# Altium footprint library lib_datalogger.PcbLib: 866 footprints (part 38 of 55)
Each footprint in its own frame and in the unit in brackets; x right, y up, seen from the top. Pads: shape width x height; smd on the part's side, far side on the other; paste and mask are expansions set on the pad; w line width, h text height; cw(c..) or ccw(c..) is an arc to the next point about the centre after c.
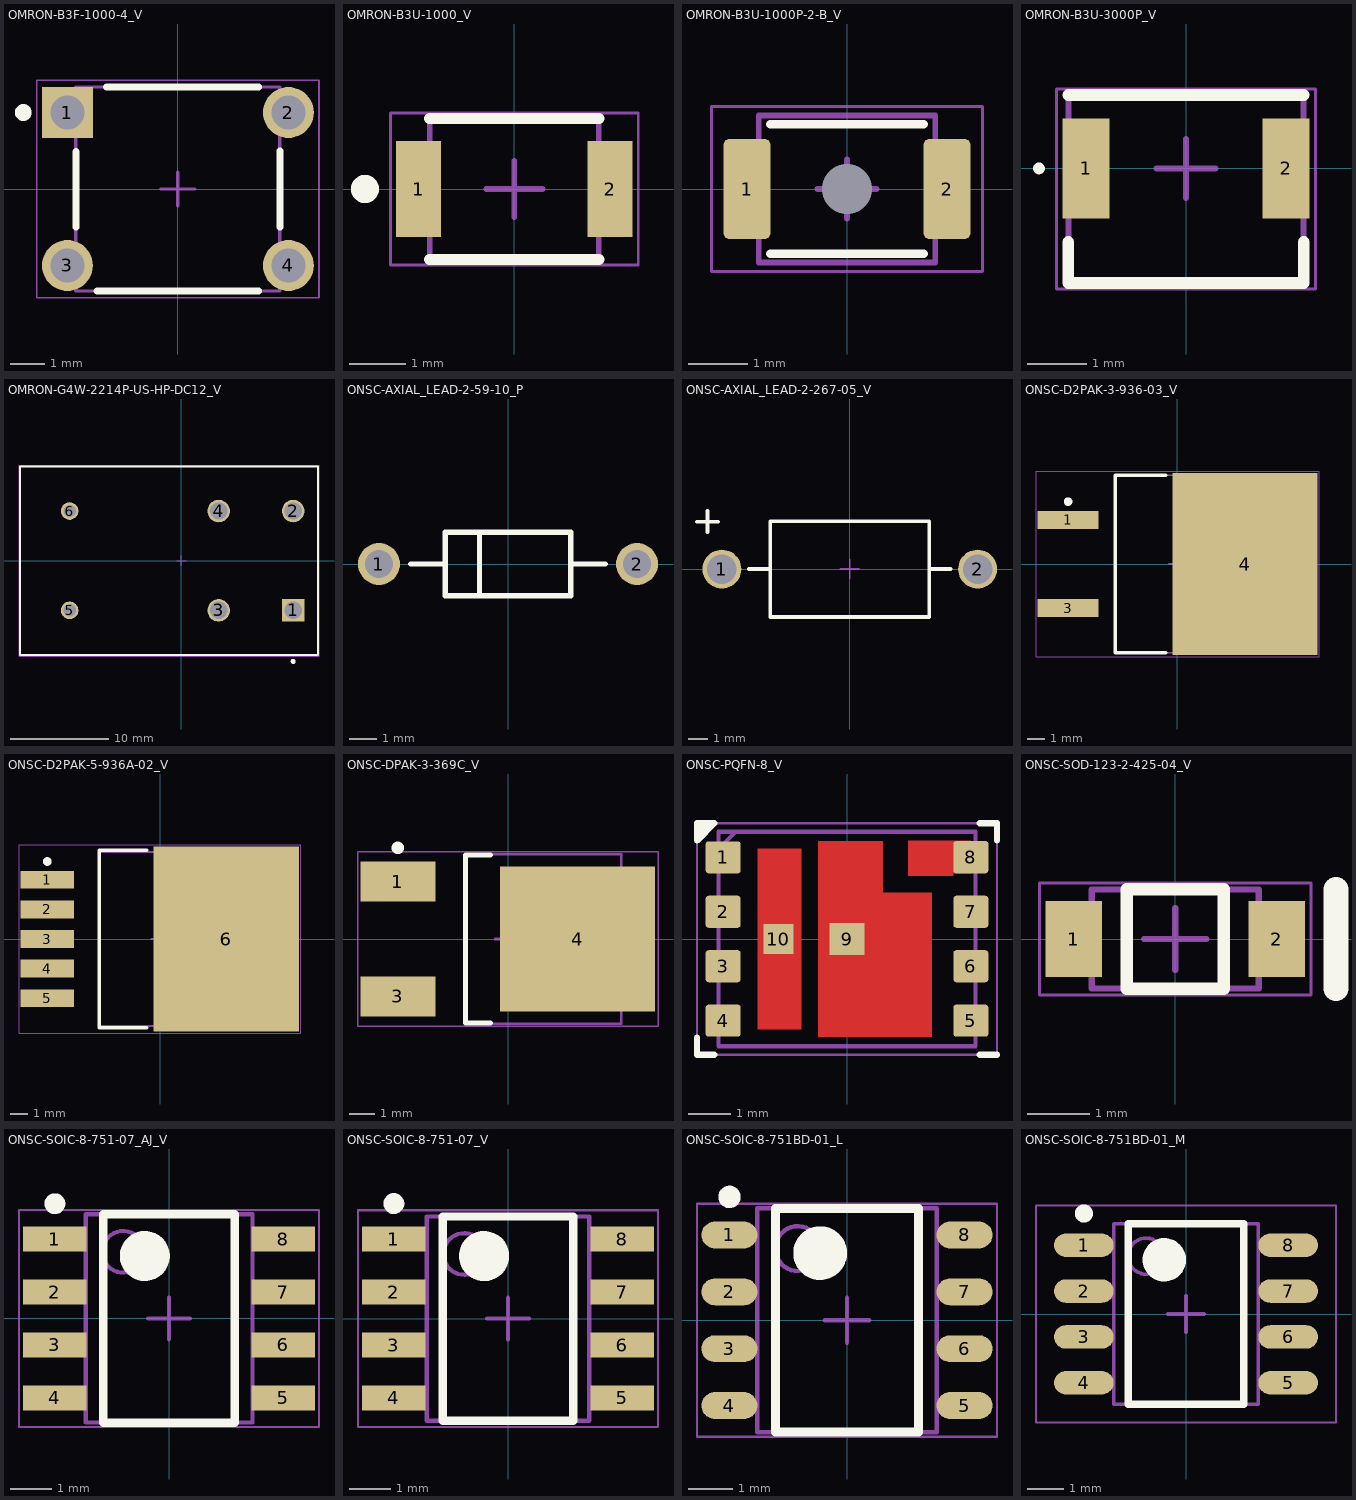
[diagram p37: the footprints below, top view; thin cyan lines are the x and y axes]

## OMRON-B3F-1000-4_V [mm] "TH, 4-Leads, Body 6x6mm"
height 4.5
pads (4):
  rect 1.5x1.5 hole 1 paste+0: 1(-3.25,2.25)
  round 1.5 hole 1 paste+0: 2(3.25,2.25) 4(3.25,-2.25)
  round 1.5 hole 1 paste+0 mask+0.102: 3(-3.25,-2.25)
Top Overlay:
  circle w0.25: c-4.55,2.25 r0.125
  lines w0.2: -3,-1.127 -3,1.1 ; -2.378,-3 2.378,-3 ; -2.1,3 2.378,3 ; 3,-1.127 3,1.127
Mechanical 13:
  lines w0.1: -3,-3 -3,3 3,3 3,-3 -3,-3
Mechanical 15:
  lines w0.05: -4.15,-3.2 -4.15,3.2 4.15,3.2 4.15,-3.2 -4.15,-3.2
  lines w0.1: -0.5,0 0.5,0 ; 0,-0.5 0,0.5
3D body: height 3.7, standoff 0.1, extent -2.499,1.501 -1.501,2.499
3D body: height 3.7, standoff 0.1, extent 1.501,-2.499 2.499,-1.501
3D body: height 3.7, standoff 0.1, extent -2.499,-2.499 -1.501,-1.501
3D body: height 3.7, standoff 0.1, extent 1.501,1.501 2.499,2.499
3D body: height 0.5, standoff -3.5, extent 3.101,1.901 3.4,2.599
3D body: height 0.8, standoff 0.5, extent 2.801,1.901 3.4,2.599
3D body: height 0.5, standoff -3.5, extent -3.4,-2.599 -3.101,-1.901
3D body: height 0.8, standoff 0.5, extent -3.4,-2.599 -2.801,-1.901
3D body: height 0.5, standoff -3.5, extent 3.101,-2.599 3.4,-1.901
3D body: height 0.8, standoff 0.5, extent 2.801,-2.599 3.4,-1.901
3D body: height 0.8, standoff 0.5, extent -3.4,1.901 -2.801,2.599
3D body: height 0.5, standoff -3.5, extent -3.4,1.901 -3.101,2.599
3D body: height 4.5, standoff 0.1, extent -1.75,-1.75 1.749,1.749
3D body: height 3.4, standoff 0, extent -3,-3 3,3

## OMRON-B3U-1000_V [mm] "SMD, 2-Leads, Body 3x2.5mm"
height 1.75
pads (2):
  rect 0.8x1.7 smd: 1(-1.7,0) 2(1.7,0)
Top Overlay:
  circle w0.25: c-2.65,0 r0.125
  lines w0.2: -1.5,-1.25 1.5,-1.25 ; -1.5,1.25 1.5,1.25
Mechanical 13:
  lines w0.1: -1.5,-1.25 1.5,-1.25 1.5,1.25 -1.5,1.25 -1.5,-1.25
Mechanical 15:
  lines w0.05: -2.2,-1.35 2.2,-1.35 2.2,1.35 -2.2,1.35 -2.2,-1.35
  lines w0.1: -0.5,0 0.5,0 ; 0,-0.5 0,0.5
3D body: height 1.75, standoff 1.35, extent -0.75,-0.75 0.75,0.75
3D body: height 1.35, standoff 0, extent -1.5,-1.25 1.5,1.25

## OMRON-B3U-1000P-2-B_V [mm] "SMT, 2-Leads, Body 3x2.5mm"
height 1.75
pads (3):
  rrect25% 0.8x1.7 smd: 1(-1.7,0) 2(1.7,0)
  round 0 hole 0.85 unplated: H1(0,0)
Top Overlay:
  lines w0.15: -1.3,-1.1 1.3,-1.1 ; -1.3,1.1 1.3,1.1
Mechanical 13:
  lines w0.1: -1.5,-1.25 1.5,-1.25 1.5,1.25 -1.5,1.25 -1.5,-1.25
Mechanical 15:
  lines w0.05: -2.3,-1.4 2.3,-1.4 2.3,1.4 -2.3,1.4 -2.3,-1.4
  lines w0.1: -0.5,0 0.5,0 ; 0,-0.5 0,0.5
Top Designator:
  text ".Designator" at -1.27,-0.127 h0.6
3D body "OMRON_B3U1000P.step": height 1.6, standoff 0, extent -2,-1.25 2,1.25

## OMRON-B3U-3000P_V [mm] "SMD, 2-Leads, Body 4x3.2mm"
height 1.35
pads (2):
  rect 0.8x1.7 smd: 1(-1.7,0) 2(1.7,0)
Top Overlay:
  circle w0.1: c-2.5,0 r0.05
  lines w0.2: -2,-1.25 -2,-1.95 2,-1.95 2,-1.25 ; -2,1.25 2,1.25
Mechanical 13:
  lines w0.1: -2,-1.95 -2,1.25 2,1.25 2,-1.95 -2,-1.95
Mechanical 15:
  lines w0.05: -2.2,-2.05 2.2,-2.05 2.2,1.35 -2.2,1.35 -2.2,-2.05
  lines w0.1: -0.5,0 0.5,0 ; 0,-0.5 0,0.5
3D body "B3U_3000P[].step": height 1.2, standoff 0, extent -2,-1.95 2,1.25

## OMRON-G4W-2214P-US-HP-DC12_V [mm] "Relay, 6-Leads, Body 30.48x19.3mm"
height 30.48
pads (6):
  rect 2.3x2.3 hole 1.778: 1(11.43,-5.08)
  round 2.3 hole 1.778: 2(11.43,5.08) 3(3.81,-5.08) 4(3.81,5.08)
  round 1.8 hole 1.27: 5(-11.43,-5.08) 6(-11.43,5.08)
Top Overlay:
  circle w0.25: c11.43,-10.3 r0.125
  lines w0.2: -16.51,-9.65 13.97,-9.65 13.97,9.65 -16.51,9.65 -16.51,-9.65
Mechanical 13:
  lines w0.1: -16.51,-9.65 13.97,-9.65 13.97,9.65 -16.51,9.65 -16.51,-9.65
Mechanical 15:
  lines w0.05: -16.61,-9.75 14.07,-9.75 14.07,9.75 -16.61,9.75 -16.61,-9.75
  lines w0.1: -0.5,0 0.5,0 ; 0,-0.5 0,0.5
3D body: height 30.48, standoff 0, extent -16.509,-9.649 13.969,9.649

## ONSC-AXIAL_LEAD-2-59-10_P [mm] "AXIAL, 2-Leads, Diameter 2.35mm"
height 2.35
pads (2):
  round 1.55 hole 1.05: 1(-4.77,0) 2(4.77,0)
Top Overlay:
  lines w0.2: -3.595,0 -2.325,0 ; -1.055,-1.175 -1.055,1.175 ; 2.325,0 3.595,0 ; -2.325,-1.175 2.325,-1.175 2.325,1.175 -2.325,1.175 -2.325,-1.175
Mechanical 13:
  lines w0.1: -1.055,-1.175 -1.055,1.175 ; -2.325,-1.175 -2.325,1.175 2.325,1.175 2.325,-1.175 -2.325,-1.175
3D body: height 2.34, standoff 0, extent -1.155,-1.174 -0.955,1.174
3D body: height 1.17, standoff -6, extent 4.381,-0.392 5.163,0.392
3D body: height 1.17, standoff -6, extent -5.159,-0.392 -4.377,0.392
3D body: height 1.57, standoff 0.78, extent 4.378,-0.39 5.163,0.39
3D body: height 1.57, standoff 0.78, extent -5.162,-0.39 -4.377,0.39
3D body: height 1.56, standoff 0.78, extent -4.77,-0.392 4.77,0.392
3D body: height 2.34, standoff 0, extent -2.325,-1.173 2.325,1.173

## ONSC-AXIAL_LEAD-2-267-05_V [mm] "AXIAL, 2-Leads, Diameter 5.05mm"
height 5.3
pads (2):
  round 2.05 hole 1.55: 1(-6.745,0) 2(6.745,0)
Top Overlay:
  lines w0.2: -8.06,2.5 -6.94,2.5 ; -7.5,1.94 -7.5,3.06 ; -5.32,0 -4.2,0 ; 4.2,0 5.32,0 ; -4.2,-2.525 -4.2,2.525 4.2,2.525 4.2,-2.525 -4.2,-2.525
Mechanical 13:
  lines w0.1: -4.2,-2.525 4.2,-2.525 4.2,2.525 -4.2,2.525 -4.2,-2.525
Mechanical 15:
  lines w0.1: -0.5,0 0.5,0 ; 0,-0.5 0,0.5
3D body: height 2.53, standoff -4.47, extent 6.125,-0.624 7.37,0.624
3D body: height 2.53, standoff -4.47, extent -7.365,-0.624 -6.12,0.624
3D body: height 3.15, standoff 1.9, extent 6.126,-0.622 7.37,0.623
3D body: height 3.15, standoff 1.9, extent -7.364,-0.622 -6.12,0.623
3D body: height 3.15, standoff 1.9, extent -6.745,-0.624 6.745,0.624
3D body: height 5.07, standoff 0.03, extent -4.2,-2.497 4.2,2.547

## ONSC-D2PAK-3-936-03_V [mm] "DPAK, 3-Leads, Body 10.24x9.35mm, Pitch 2.54mm"
height 4.572
pads (3):
  rect 3.504x1.016 smd: 1(-6.313,2.54) 3(-6.313,-2.54)
  rect 8.38x10.49 smd: 4(3.9,0)
Top Overlay:
  circle w0.25: c-6.313,3.598 r0.125
  lines w0.2: -0.69,-5.12 -3.6,-5.12 -3.6,5.12 -0.69,5.12
Mechanical 13:
  lines w0.1: -3.6,-5.12 -3.6,5.12 5.75,5.12 5.75,-5.12 -3.6,-5.12
Mechanical 15:
  lines w0.05: -8.164,-5.345 -8.164,5.345 8.189,5.345 8.189,-5.345 -8.164,-5.345
  lines w0.1: -0.5,0 0.5,0 ; 0,-0.5 0,0.5
3D body "DPAK254P1420X475-3L.step": height 4.75, standoff 0, extent -6.113,-5.125 8.086,5.125

## ONSC-D2PAK-5-936A-02_V [mm] "DPAK, 5-Leads, Body 10.02x9.194mm, Pitch 1.702mm"
height 4.58
pads (6):
  rect 3.05x1.016 smd: 1(-6.505,3.4) 2(-6.505,1.7) 3(-6.505,0) 4(-6.505,-1.7) 5(-6.505,-3.4)
  rect 8.38x10.66 smd: 6(3.8,0)
Top Overlay:
  circle w0.25: c-6.505,4.458 r0.125
  lines w0.2: -0.79,-5.118 -3.5,-5.118 -3.5,5.118 -0.79,5.118
Mechanical 13:
  lines w0.1: -3.5,-5.01 -3.5,5.01 5.694,5.01 5.694,-5.01 -3.5,-5.01
Mechanical 15:
  lines w0.05: -8.13,-5.43 -8.13,5.43 8.09,5.43 8.09,-5.43 -8.13,-5.43
  lines w0.1: -0.5,0 0.5,0 ; 0,-0.5 0,0.5
3D body "DPAK170P1420X457-6L.step": height 4.57, standoff 0, extent -6.219,-5.01 7.98,5.01

## ONSC-DPAK-3-369C_V [mm] "DPAK, 3-Leads, Body 6.22x6.75mm, Pitch 2.29mm"
height 2.47
pads (3):
  rect 3x1.6 smd: 1(-4.4,2.29) 3(-4.4,-2.29)
  rect 6.2x5.8 smd: 4(2.78,0)
Top Overlay:
  circle w0.25: c-4.4,3.64 r0.125
  lines w0.2: -0.7,-3.35 -1.7,-3.35 -1.7,3.35 -0.7,3.35
Mechanical 13:
  lines w0.1: -1.7,-3.375 4.52,-3.375 4.52,3.375 -1.7,3.375 -1.7,-3.375
Mechanical 15:
  lines w0.05: -5.99,-3.475 5.99,-3.475 5.99,3.475 -5.99,3.475 -5.99,-3.475
  lines w0.1: -0.5,0 0.5,0 ; 0,-0.5 0,0.5
3D body "DPAK229P991X246-3L.step": height 2.46, standoff 0, extent -5.385,-3.375 4.52,3.375

## ONSC-PQFN-8_V [mm] "QFN, 8-Leads, Body 5x6mm, Pitch 1.27mm"
height 0.8
pads (10):
  rrect20% 0.82x0.75 smd: 1(-2.89,1.905) 2(-2.89,0.635) 3(-2.89,-0.635) 4(-2.89,-1.905) 5(2.89,-1.905) 6(2.89,-0.635) 7(2.89,0.635)
  rrect20% 0.82x0.76 smd: 8(2.89,1.91)
  rect 0.82x0.75 smd: 9(0,0)
  rect 0.7x0.7 smd: 10(-1.6,0)
Top Layer:
  region: -1.07,-2.1 -1.07,2.1 -2.08,2.1 -2.08,-2.1
  region: 1.98,-2.28 -0.67,-2.28 -0.67,2.28 0.83,2.28 0.83,1.08 1.98,1.08
  region: 2.48,1.48 2.48,1.53 2.89,1.53 2.89,2.29 1.43,2.29 1.43,1.48
Top Overlay:
  region: -3.5,2.7 -3.5,2.3 -3.1,2.7
  lines w0.15: -3.5,-2.3 -3.5,-2.7 -3.1,-2.7 ; 3.1,-2.7 3.5,-2.7 ; 3.1,2.7 3.5,2.7 3.5,2.3 ; -3.5,2.3 -3.5,2.7 -3.1,2.7 -3.5,2.3
Mechanical 13:
  lines w0.1: -3,2.1 -2.6,2.5 ; -3,-2.5 -3,2.5 3,2.5 3,-2.5 -3,-2.5
Mechanical 15:
  lines w0.05: -3.5,-2.7 3.5,-2.7 3.5,2.7 -3.5,2.7 -3.5,-2.7
  lines w0.1: -0.5,0 0.5,0 ; 0,-0.5 0,0.5
Top Designator:
  text ".Designator" at -0.762,-1.27 h0.6
3D body: height 0.8, standoff 0, extent -3,-2.5 3,2.5

## ONSC-SOD-123-2-425-04_V [mm] "SOD, 2-Leads, Body 2.69x1.6mm"
height 1.35
pads (2):
  rect 0.91x1.22 smd: 1(-1.635,0) 2(1.635,0)
Top Overlay:
  lines w0.2: -0.78,-0.8 -0.78,0.8 0.78,0.8 0.78,-0.8 -0.78,-0.8
  lines w0.4: 2.59,-0.8 2.59,0.8
Mechanical 13:
  lines w0.1: -1.345,-0.8 -1.345,0.8 1.345,0.8 1.345,-0.8 -1.345,-0.8
Mechanical 15:
  lines w0.05: -2.19,-0.9 -2.19,0.9 2.19,0.9 2.19,-0.9 -2.19,-0.9
  lines w0.1: -0.5,0 0.5,0 ; 0,-0.5 0,0.5
3D body: height 1.35, standoff 0, extent -1.345,-0.8 1.345,0.8

## ONSC-SOIC-8-751-07_AJ_V [mm] "SOIC, 8-Leads, Body 5x4mm, Pitch 1.27mm"
height 1.75
pads (8):
  rect 1.52x0.6 smd: 1(-2.74,1.905) 2(-2.74,0.635) 3(-2.74,-0.635) 4(-2.74,-1.905) 5(2.74,-1.905) 6(2.74,-0.635) 7(2.74,0.635) 8(2.74,1.905)
Top Overlay:
  circle w0.6: c-0.58,1.5 r0.3
  circle w0.25: c-2.74,2.755 r0.125
  lines w0.2: -1.58,-2.5 1.58,-2.5 1.58,2.5 -1.58,2.5 -1.58,-2.5
Mechanical 13:
  circle w0.1: c-1.1,1.6 r0.5
  lines w0.1: -2,-2.5 2,-2.5 2,2.5 -2,2.5 -2,-2.5
Mechanical 15:
  lines w0.05: -3.6,-2.6 3.6,-2.6 3.6,2.6 -3.6,2.6 -3.6,-2.6
  lines w0.1: -0.5,0 0.5,0 ; 0,-0.5 0,0.5
3D body "ONSC-SOIC-8-751-07_AJ_V.step": height 1.75, standoff 0, extent -3,-2.5 3,2.5

## ONSC-SOIC-8-751-07_V [mm] "SOIC, 8-Leads, Body 4.9x3.9mm, Pitch 1.27mm"
height 1.75
pads (8):
  rect 1.52x0.6 smd: 1(-2.74,1.905) 2(-2.74,0.635) 3(-2.74,-0.635) 4(-2.74,-1.905) 5(2.74,-1.905) 6(2.74,-0.635) 7(2.74,0.635) 8(2.74,1.905)
Top Overlay:
  circle w0.25: c-2.74,2.76 r0.125
  circle w0.6: c-0.575,1.5 r0.3
  lines w0.2: -1.569,-2.45 -1.569,2.45 1.569,2.45 1.569,-2.45 -1.569,-2.45
Mechanical 13:
  circle w0.1: c-1.05,1.55 r0.5
  lines w0.1: -1.95,-2.45 -1.95,2.45 1.95,2.45 1.95,-2.45 -1.95,-2.45
Mechanical 15:
  lines w0.05: -3.6,-2.6 -3.6,2.6 3.6,2.6 3.6,-2.6 -3.6,-2.6
  lines w0.1: -0.5,0 0.5,0 ; 0,-0.5 0,0.5
3D body "SOIC127P600X175-8L.step": height 1.75, standoff 0, extent -3,-2.5 3,2.5

## ONSC-SOIC-8-751BD-01_L [mm] "SOIC, 8-Leads, Body 5x4mm, Pitch 1.27mm, IPC High Density"
height 1.75
pads (8):
  oval 1.25x0.6 smd: 1(-2.625,1.905) 2(-2.625,0.635) 3(-2.625,-0.635) 4(-2.625,-1.905) 5(2.625,-1.905) 6(2.625,-0.635) 7(2.625,0.635) 8(2.625,1.905)
Top Overlay:
  circle w0.25: c-2.625,2.755 r0.125
  circle w0.6: c-0.6,1.5 r0.3
  lines w0.2: -1.6,-2.5 -1.6,2.5 1.6,2.5 1.6,-2.5 -1.6,-2.5
Mechanical 13:
  circle w0.1: c-1.1,1.6 r0.5
  lines w0.1: -2,-2.5 -2,2.5 2,2.5 2,-2.5 -2,-2.5
Mechanical 15:
  lines w0.05: -3.35,-2.6 -3.35,2.6 3.35,2.6 3.35,-2.6 -3.35,-2.6
  lines w0.1: -0.5,0 0.5,0 ; 0,-0.5 0,0.5
3D body "SOIC127P600X175-8L.step": height 1.75, standoff 0, extent -3,-2.5 3,2.5

## ONSC-SOIC-8-751BD-01_M [mm] "SOIC, 8-Leads, Body 5x4mm, Pitch 1.27mm, IPC Low Density"
height 1.75
pads (8):
  oval 1.65x0.65 smd: 1(-2.825,1.905) 2(-2.825,0.635) 3(-2.825,-0.635) 4(-2.825,-1.905) 5(2.825,-1.905) 6(2.825,-0.635) 7(2.825,0.635) 8(2.825,1.905)
Top Overlay:
  circle w0.25: c-2.825,2.78 r0.125
  circle w0.6: c-0.6,1.5 r0.3
  lines w0.2: -1.6,-2.5 -1.6,2.5 1.6,2.5 1.6,-2.5 -1.6,-2.5
Mechanical 13:
  circle w0.1: c-1.1,1.6 r0.5
  lines w0.1: -2,-2.5 -2,2.5 2,2.5 2,-2.5 -2,-2.5
Mechanical 15:
  lines w0.05: -4.15,-3 -4.15,3 4.15,3 4.15,-3 -4.15,-3
  lines w0.1: -0.5,0 0.5,0 ; 0,-0.5 0,0.5
3D body "SOIC127P600X175-8M.step": height 1.75, standoff 0, extent -3,-2.5 3,2.5